# Altium footprint library 排针排座.PcbLib: 344 footprints (part 16 of 22)
Each footprint in its own frame and in the unit in brackets; x right, y up, seen from the top. Pads: shape width x height; smd on the part's side, far side on the other; paste and mask are expansions set on the pad; w line width, h text height; cw(c..) or ccw(c..) is an arc to the next point about the centre after c.
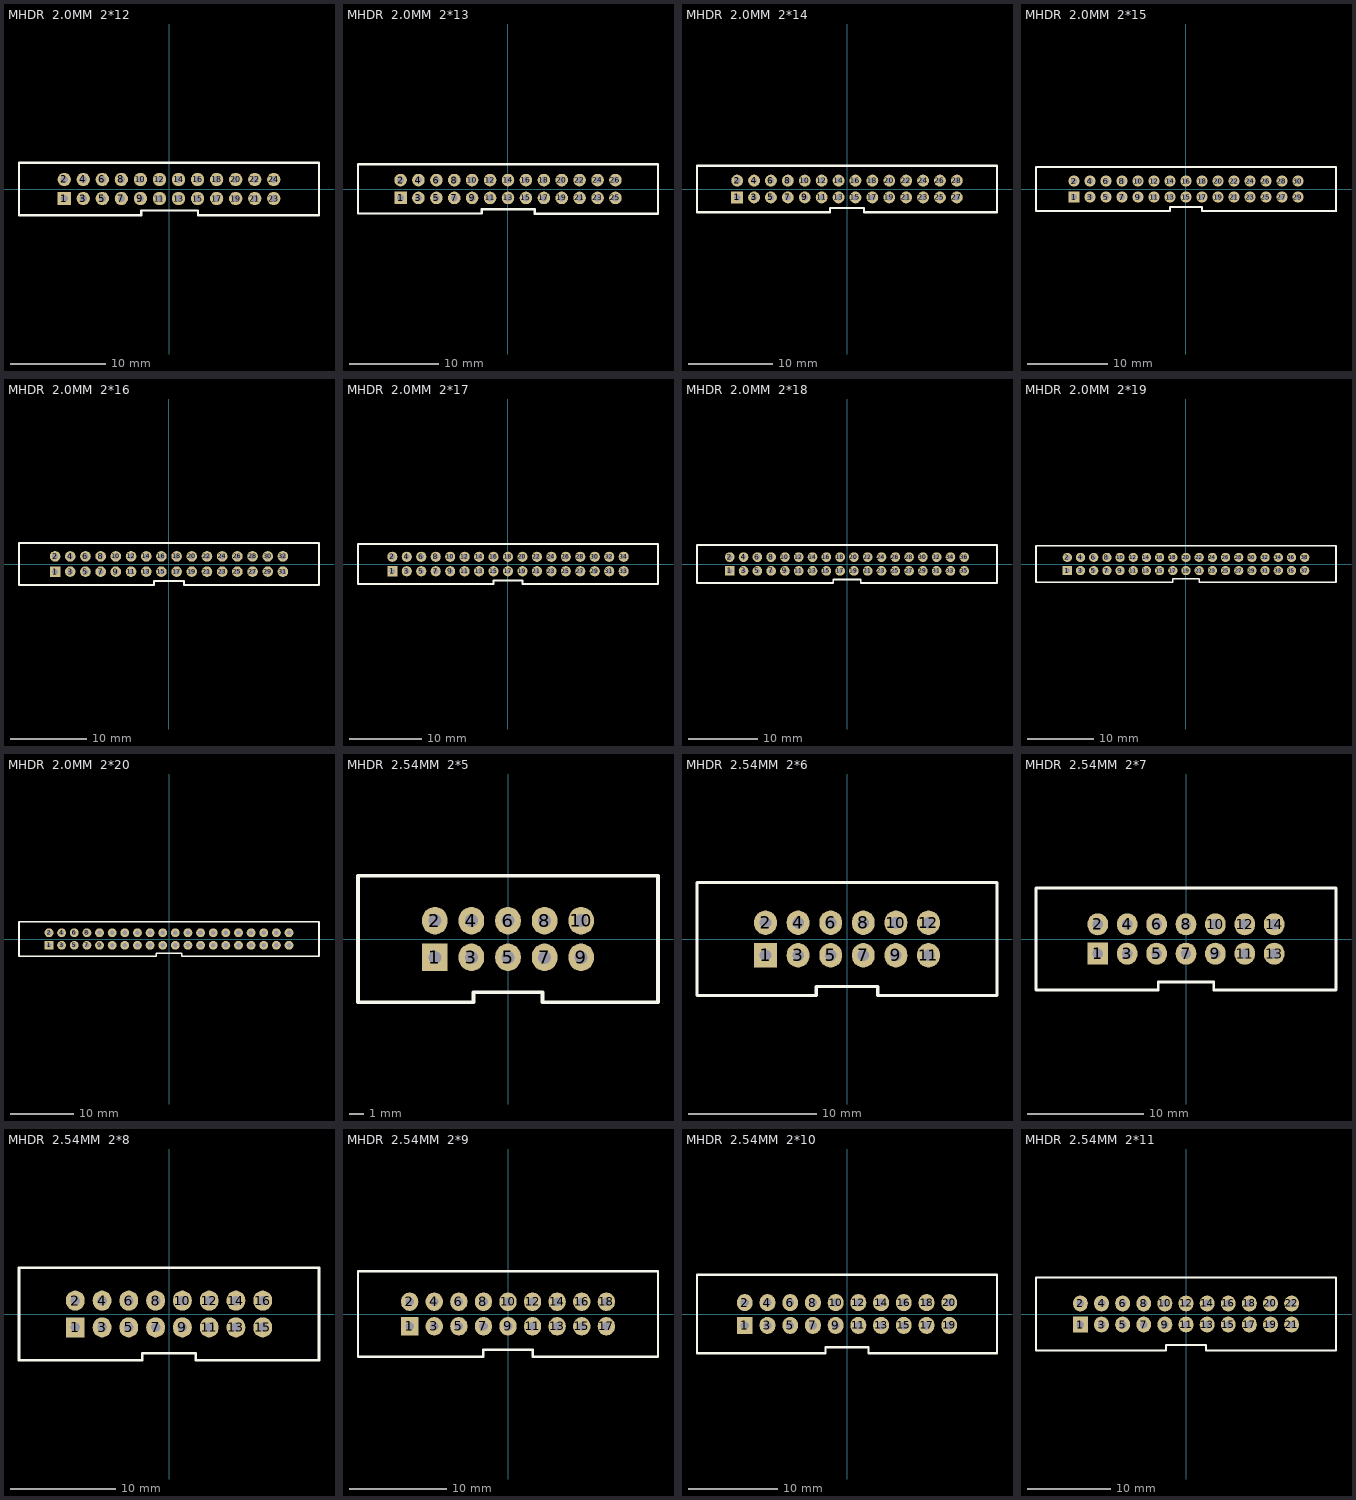
[diagram p15: the footprints below, top view; thin cyan lines are the x and y axes]

## MHDR  2.0MM  2*12 [mm] "24pins"
pads (24):
  rect 1.4x1.4 hole 0.75: 1(-11,-1)
  round 1.4 hole 0.75: 2(-11,1) 3(-9,-1) 4(-9,1) 5(-7,-1) 6(-7,1) 7(-5,-1) 8(-5,1) 9(-3,-1) 10(-3,1) 11(-1,-1) 12(-1,1) 13(1,-1) 14(1,1) 15(3,-1) 16(3,1) 17(5,-1) 18(5,1) 19(7,-1) 20(7,1) 21(9,-1) 22(9,1) 23(11,-1) 24(11,1)
Top Overlay:
  lines w0.254: 15.75,-2.754 3.048,-2.754 3.048,-2.261 -2.896,-2.261 -2.896,-2.747 -15.75,-2.747 -15.75,2.753 15.75,2.755 ; 15.75,-2.753 15.75,2.747
3D body "MHDR2.00_24P.step": height 5.9, standoff -2.9, extent -15.9,-2.9 15.9,2.9

## MHDR  2.0MM  2*13 [mm] "26pins"
pads (26):
  rect 1.4x1.4 hole 0.75: 1(-12,-1)
  round 1.4 hole 0.75: 2(-12,1) 3(-10,-1) 4(-10,1) 5(-8,-1) 6(-8,1) 7(-6,-1) 8(-6,1) 9(-4,-1) 10(-4,1) 11(-2,-1) 12(-2,1) 13(0,-1) 14(0,1) 15(2,-1) 16(2,1) 17(4,-1) 18(4,1) 19(6,-1) 20(6,1) 21(8,-1) 22(8,1) 23(10,-1) 24(10,1) 25(12,-1) 26(12,1)
Top Overlay:
  lines w0.254: 16.75,-2.754 2.997,-2.754 2.997,-2.261 -2.946,-2.261 -2.946,-2.747 -16.75,-2.747 -16.75,2.753 16.75,2.755 ; 16.75,-2.753 16.75,2.747
3D body "MHDR2.00_26P.step": height 5.9, standoff -2.9, extent -16.9,-2.9 16.9,2.9

## MHDR  2.0MM  2*14 [mm] "28pins"
height 5.7
pads (28):
  rect 1.4x1.4 hole 0.75: 1(-13,-1)
  round 1.4 hole 0.75: 2(-13,1) 3(-11,-1) 4(-11,1) 5(-9,-1) 6(-9,1) 7(-7,-1) 8(-7,1) 9(-5,-1) 10(-5,1) 11(-3,-1) 12(-3,1) 13(-1,-1) 14(-1,1) 15(1,-1) 16(1,1) 17(3,-1) 18(3,1) 19(5,-1) 20(5,1) 21(7,-1) 22(7,1) 23(9,-1) 24(9,1) 25(11,-1) 26(11,1) 27(13,-1) 28(13,1)
Top Overlay:
  lines w0.254: 1.997,-2.754 17.75,-2.754 ; 2,-2.754 2,-2.261 -2,-2.261 -2,-2.747 -17.75,-2.747 -17.75,2.753 17.75,2.755 17.75,-2.745
3D body "MHDR2.00_28P.step": height 5.9, standoff -2.9, extent -17.9,-2.9 17.9,2.9

## MHDR  2.0MM  2*15 [mm] "30pins"
height 5.7
pads (30):
  rect 1.4x1.4 hole 0.75: 1(-14,-1)
  round 1.4 hole 0.75: 2(-14,1) 3(-12,-1) 4(-12,1) 5(-10,-1) 6(-10,1) 7(-8,-1) 8(-8,1) 9(-6,-1) 10(-6,1) 11(-4,-1) 12(-4,1) 13(-2,-1) 14(-2,1) 15(0,-1) 16(0,1) 17(2,-1) 18(2,1) 19(4,-1) 20(4,1) 21(6,-1) 22(6,1) 23(8,-1) 24(8,1) 25(10,-1) 26(10,1) 27(12,-1) 28(12,1) 29(14,-1) 30(14,1)
Top Overlay:
  lines w0.254: 18.75,2.747 18.75,-2.753 18.749,-2.754 2,-2.754 2,-2.261 -2,-2.261 -2,-2.747 -18.75,-2.747 -18.75,2.753 18.75,2.755
3D body "MHDR2.00_30P.step": height 5.9, standoff -2.9, extent -18.9,-2.9 18.9,2.9

## MHDR  2.0MM  2*16 [mm] "32pins"
height 5.7
pads (32):
  rect 1.4x1.4 hole 0.75: 1(-15,-1)
  round 1.4 hole 0.75: 2(-15,1) 3(-13,-1) 4(-13,1) 5(-11,-1) 6(-11,1) 7(-9,-1) 8(-9,1) 9(-7,-1) 10(-7,1) 11(-5,-1) 12(-5,1) 13(-3,-1) 14(-3,1) 15(-1,-1) 16(-1,1) 17(1,-1) 18(1,1) 19(3,-1) 20(3,1) 21(5,-1) 22(5,1) 23(7,-1) 24(7,1) 25(9,-1) 26(9,1) 27(11,-1) 28(11,1) 29(13,-1) 30(13,1) 31(15,-1) 32(15,1)
Top Overlay:
  lines w0.254: 19.75,-2.754 2,-2.754 2,-2.261 -2,-2.261 -2,-2.747 -19.75,-2.747 -19.75,2.753 19.75,2.755 ; 19.75,-2.753 19.75,2.747
3D body "MHDR2.00_32P.step": height 5.9, standoff -2.9, extent -19.9,-2.9 19.9,2.9

## MHDR  2.0MM  2*17 [mm] "34pins"
height 5.7
pads (34):
  rect 1.4x1.4 hole 0.75: 1(-16,-1)
  round 1.4 hole 0.75: 2(-16,1) 3(-14,-1) 4(-14,1) 5(-12,-1) 6(-12,1) 7(-10,-1) 8(-10,1) 9(-8,-1) 10(-8,1) 11(-6,-1) 12(-6,1) 13(-4,-1) 14(-4,1) 15(-2,-1) 16(-2,1) 17(0,-1) 18(0,1) 19(2,-1) 20(2,1) 21(4,-1) 22(4,1) 23(6,-1) 24(6,1) 25(8,-1) 26(8,1) 27(10,-1) 28(10,1) 29(12,-1) 30(12,1) 31(14,-1) 32(14,1) 33(16,-1) 34(16,1)
Top Overlay:
  lines w0.254: 20.75,-2.754 2,-2.754 2,-2.261 -2,-2.261 -2,-2.747 -20.75,-2.747 -20.75,2.753 20.75,2.755 ; 20.75,-2.753 20.75,2.747
3D body "MHDR2.00_34P.step": height 5.9, standoff -2.9, extent -20.9,-2.9 20.9,2.9

## MHDR  2.0MM  2*18 [mm] "36pins"
height 5.7
pads (36):
  rect 1.4x1.4 hole 0.75: 1(-17,-1)
  round 1.4 hole 0.75: 2(-17,1) 3(-15,-1) 4(-15,1) 5(-13,-1) 6(-13,1) 7(-11,-1) 8(-11,1) 9(-9,-1) 10(-9,1) 11(-7,-1) 12(-7,1) 13(-5,-1) 14(-5,1) 15(-3,-1) 16(-3,1) 17(-1,-1) 18(-1,1) 19(1,-1) 20(1,1) 21(3,-1) 22(3,1) 23(5,-1) 24(5,1) 25(7,-1) 26(7,1) 27(9,-1) 28(9,1) 29(11,-1) 30(11,1) 31(13,-1) 32(13,1) 33(15,-1) 34(15,1) 35(17,-1) 36(17,1)
Top Overlay:
  lines w0.254: 21.75,-2.754 2,-2.754 2,-2.261 -2,-2.261 -2,-2.747 -21.75,-2.747 -21.75,2.753 21.75,2.756 ; 21.75,-2.753 21.75,2.747
3D body "MHDR2.00_36P.step": height 5.9, standoff -2.9, extent -21.9,-2.9 21.9,2.9

## MHDR  2.0MM  2*19 [mm] "38pins"
height 5.7
pads (38):
  rect 1.4x1.4 hole 0.75: 1(-18,-1)
  round 1.4 hole 0.75: 2(-18,1) 3(-16,-1) 4(-16,1) 5(-14,-1) 6(-14,1) 7(-12,-1) 8(-12,1) 9(-10,-1) 10(-10,1) 11(-8,-1) 12(-8,1) 13(-6,-1) 14(-6,1) 15(-4,-1) 16(-4,1) 17(-2,-1) 18(-2,1) 19(0,-1) 20(0,1) 21(2,-1) 22(2,1) 23(4,-1) 24(4,1) 25(6,-1) 26(6,1) 27(8,-1) 28(8,1) 29(10,-1) 30(10,1) 31(12,-1) 32(12,1) 33(14,-1) 34(14,1) 35(16,-1) 36(16,1) 37(18,-1) 38(18,1)
Top Overlay:
  lines w0.254: 22.75,-2.754 2,-2.754 2,-2.261 -2,-2.261 -2,-2.747 -22.75,-2.747 -22.75,2.753 22.75,2.756 ; 22.75,-2.753 22.75,2.747
3D body "MHDR2.00_38P.step": height 5.9, standoff -2.9, extent -22.9,-2.9 22.9,2.9

## MHDR  2.0MM  2*20 [mm] "40pins"
height 5.7
pads (40):
  rect 1.4x1.4 hole 0.75: 1(-19,-1)
  round 1.4 hole 0.75: 2(-19,1) 3(-17,-1) 4(-17,1) 5(-15,-1) 6(-15,1) 7(-13,-1) 8(-13,1) 9(-11,-1) 10(-11,1) 11(-9,-1) 12(-9,1) 13(-7,-1) 14(-7,1) 15(-5,-1) 16(-5,1) 17(-3,-1) 18(-3,1) 19(-1,-1) 20(-1,1) 21(1,-1) 22(1,1) 23(3,-1) 24(3,1) 25(5,-1) 26(5,1) 27(7,-1) 28(7,1) 29(9,-1) 30(9,1) 31(11,-1) 32(11,1) 33(13,-1) 34(13,1) 35(15,-1) 36(15,1) 37(17,-1) 38(17,1) 39(19,-1) 40(19,1)
Top Overlay:
  lines w0.254: 23.75,-2.754 2,-2.754 2,-2.261 -2,-2.261 -2,-2.747 -23.75,-2.747 -23.75,2.753 23.75,2.756 ; 23.75,-2.753 23.75,2.747
3D body "MHDR2.00_40P.step": height 5.9, standoff -2.9, extent -23.9,-2.9 23.9,2.9

## MHDR  2.54MM  2*5 [mm] "10P"
height 8.8
pads (10):
  rect 1.778x1.905 hole 0.9: 1(-5.08,-1.27)
  oval 1.778x1.905 hole 0.9: 2(-5.08,1.27) 3(-2.54,-1.27) 4(-2.54,1.27) 5(0,-1.27) 6(0,1.27) 7(2.54,-1.27) 8(2.54,1.27) 9(5.08,-1.27) 10(5.08,1.27)
Top Overlay:
  lines w0.254: -10.42,-4.4 -3.092,-4.4 -2.4,-4.4 -2.4,-3.708 2.4,-3.708 2.4,-4.4 10.42,-4.4 10.42,4.4 -10.42,4.4 -10.42,-4.4
3D body "MHDR2.54_10P.step": height 8.8, standoff -3.2, extent -10.12,-4.4 10.12,4.4

## MHDR  2.54MM  2*6 [mm] "12P"
height 8.8
pads (12):
  rect 1.778x1.905 hole 0.9: 1(-6.35,-1.27)
  oval 1.778x1.905 hole 0.9: 2(-6.35,1.27) 3(-3.81,-1.27) 4(-3.81,1.27) 5(-1.27,-1.27) 6(-1.27,1.27) 7(1.27,-1.27) 8(1.27,1.27) 9(3.81,-1.27) 10(3.81,1.27) 11(6.35,-1.27) 12(6.35,1.27)
Top Overlay:
  lines w0.254: -11.69,-4.4 -11.69,4.4 11.69,4.4 11.69,-4.4 2.4,-4.4 2.4,-3.708 -2.4,-3.708 -2.4,-4.4 -11.69,-4.4
3D body "MHDR2.54_12P.step": height 8.8, standoff -3.2, extent -11.69,-4.4 11.69,4.4

## MHDR  2.54MM  2*7 [mm] "14P"
height 8.8
pads (14):
  rect 1.778x1.905 hole 0.9: 1(-7.62,-1.27)
  oval 1.778x1.905 hole 0.9: 2(-7.62,1.27) 3(-5.08,-1.27) 4(-5.08,1.27) 5(-2.54,-1.27) 6(-2.54,1.27) 7(0,-1.27) 8(0,1.27) 9(2.54,-1.27) 10(2.54,1.27) 11(5.08,-1.27) 12(5.08,1.27) 13(7.62,-1.27) 14(7.62,1.27)
Top Overlay:
  lines w0.254: -12.96,-4.4 -12.96,4.4 12.96,4.4 12.96,-4.4 2.4,-4.4 2.4,-3.708 -2.4,-3.708 -2.4,-4.4 -12.96,-4.4
3D body "MHDR2.54_14P.step": height 8.8, standoff -3.2, extent -12.96,-4.4 12.96,4.4

## MHDR  2.54MM  2*8 [mm] "16P"
height 8.8
pads (16):
  rect 1.778x1.905 hole 0.9: 1(-8.89,-1.27)
  oval 1.778x1.905 hole 0.9: 2(-8.89,1.27) 3(-6.35,-1.27) 4(-6.35,1.27) 5(-3.81,-1.27) 6(-3.81,1.27) 7(-1.27,-1.27) 8(-1.27,1.27) 9(1.27,-1.27) 10(1.27,1.27) 11(3.81,-1.27) 12(3.81,1.27) 13(6.35,-1.27) 14(6.35,1.27) 15(8.89,-1.27) 16(8.89,1.27)
Top Overlay:
  lines w0.254: -14.23,-4.4 -14.23,4.4 14.23,4.4 14.23,-4.4 2.54,-4.4 2.54,-3.708 -2.54,-3.708 -2.54,-4.4 -14.23,-4.4
3D body "MHDR2.54_16P.step": height 8.8, standoff -3.2, extent -14.23,-4.4 14.23,4.4

## MHDR  2.54MM  2*9 [mm] "18P"
height 8.8
pads (18):
  rect 1.778x1.905 hole 0.9: 1(-10.16,-1.27)
  oval 1.778x1.905 hole 0.9: 2(-10.16,1.27) 3(-7.62,-1.27) 4(-7.62,1.27) 5(-5.08,-1.27) 6(-5.08,1.27) 7(-2.54,-1.27) 8(-2.54,1.27) 9(0,-1.27) 10(0,1.27) 11(2.54,-1.27) 12(2.54,1.27) 13(5.08,-1.27) 14(5.08,1.27) 15(7.62,-1.27) 16(7.62,1.27) 17(10.16,-1.27) 18(10.16,1.27)
Top Overlay:
  lines w0.254: -15.5,-4.4 -2.54,-4.4 -2.54,-3.708 2.54,-3.708 2.54,-4.4 15.5,-4.4 15.5,4.4 -15.5,4.4 -15.5,-4.4
3D body "MHDR2.54_18P.step": height 8.8, standoff -3.2, extent -15.5,-4.4 15.5,4.4

## MHDR  2.54MM  2*10 [mm] "20P"
height 8.8
pads (20):
  rect 1.778x1.905 hole 0.9: 1(-11.43,-1.27)
  oval 1.778x1.905 hole 0.9: 2(-11.43,1.27) 3(-8.89,-1.27) 4(-8.89,1.27) 5(-6.35,-1.27) 6(-6.35,1.27) 7(-3.81,-1.27) 8(-3.81,1.27) 9(-1.27,-1.27) 10(-1.27,1.27) 11(1.27,-1.27) 12(1.27,1.27) 13(3.81,-1.27) 14(3.81,1.27) 15(6.35,-1.27) 16(6.35,1.27) 17(8.89,-1.27) 18(8.89,1.27) 19(11.43,-1.27) 20(11.43,1.27)
Top Overlay:
  lines w0.254: -16.77,-4.4 -2.4,-4.4 -2.4,-3.708 2.4,-3.708 2.4,-4.4 16.77,-4.4 16.77,4.4 -16.77,4.4 -16.77,-4.4
3D body "MHDR2.54_20P.step": height 8.8, standoff -3.2, extent -16.77,-4.4 16.77,4.4

## MHDR  2.54MM  2*11 [mm] "22P"
height 8.8
pads (22):
  rect 1.778x1.905 hole 0.9: 1(-12.7,-1.27)
  oval 1.778x1.905 hole 0.9: 2(-12.7,1.27) 3(-10.16,-1.27) 4(-10.16,1.27) 5(-7.62,-1.27) 6(-7.62,1.27) 7(-5.08,-1.27) 8(-5.08,1.27) 9(-2.54,-1.27) 10(-2.54,1.27) 11(0,-1.27) 12(0,1.27) 13(2.54,-1.27) 14(2.54,1.27) 15(5.08,-1.27) 16(5.08,1.27) 17(7.62,-1.27) 18(7.62,1.27) 19(10.16,-1.27) 20(10.16,1.27) 21(12.7,-1.27) 22(12.7,1.27)
Top Overlay:
  lines w0.254: -18.04,-4.4 -2.4,-4.4 -2.4,-3.708 2.4,-3.708 2.4,-4.4 18.04,-4.4 18.04,4.4 -18.04,4.4 -18.04,-4.4
3D body "MHDR2.54_22P.step": height 8.8, standoff -3.2, extent -18.04,-4.4 18.04,4.4